# Altium footprint library YS_PCBLIB.PcbLib: 133 footprints (part 1 of 9)
Each footprint in its own frame and in the unit in brackets; x right, y up, seen from the top. Pads: shape width x height; smd on the part's side, far side on the other; paste and mask are expansions set on the pad; w line width, h text height; cw(c..) or ccw(c..) is an arc to the next point about the centre after c.
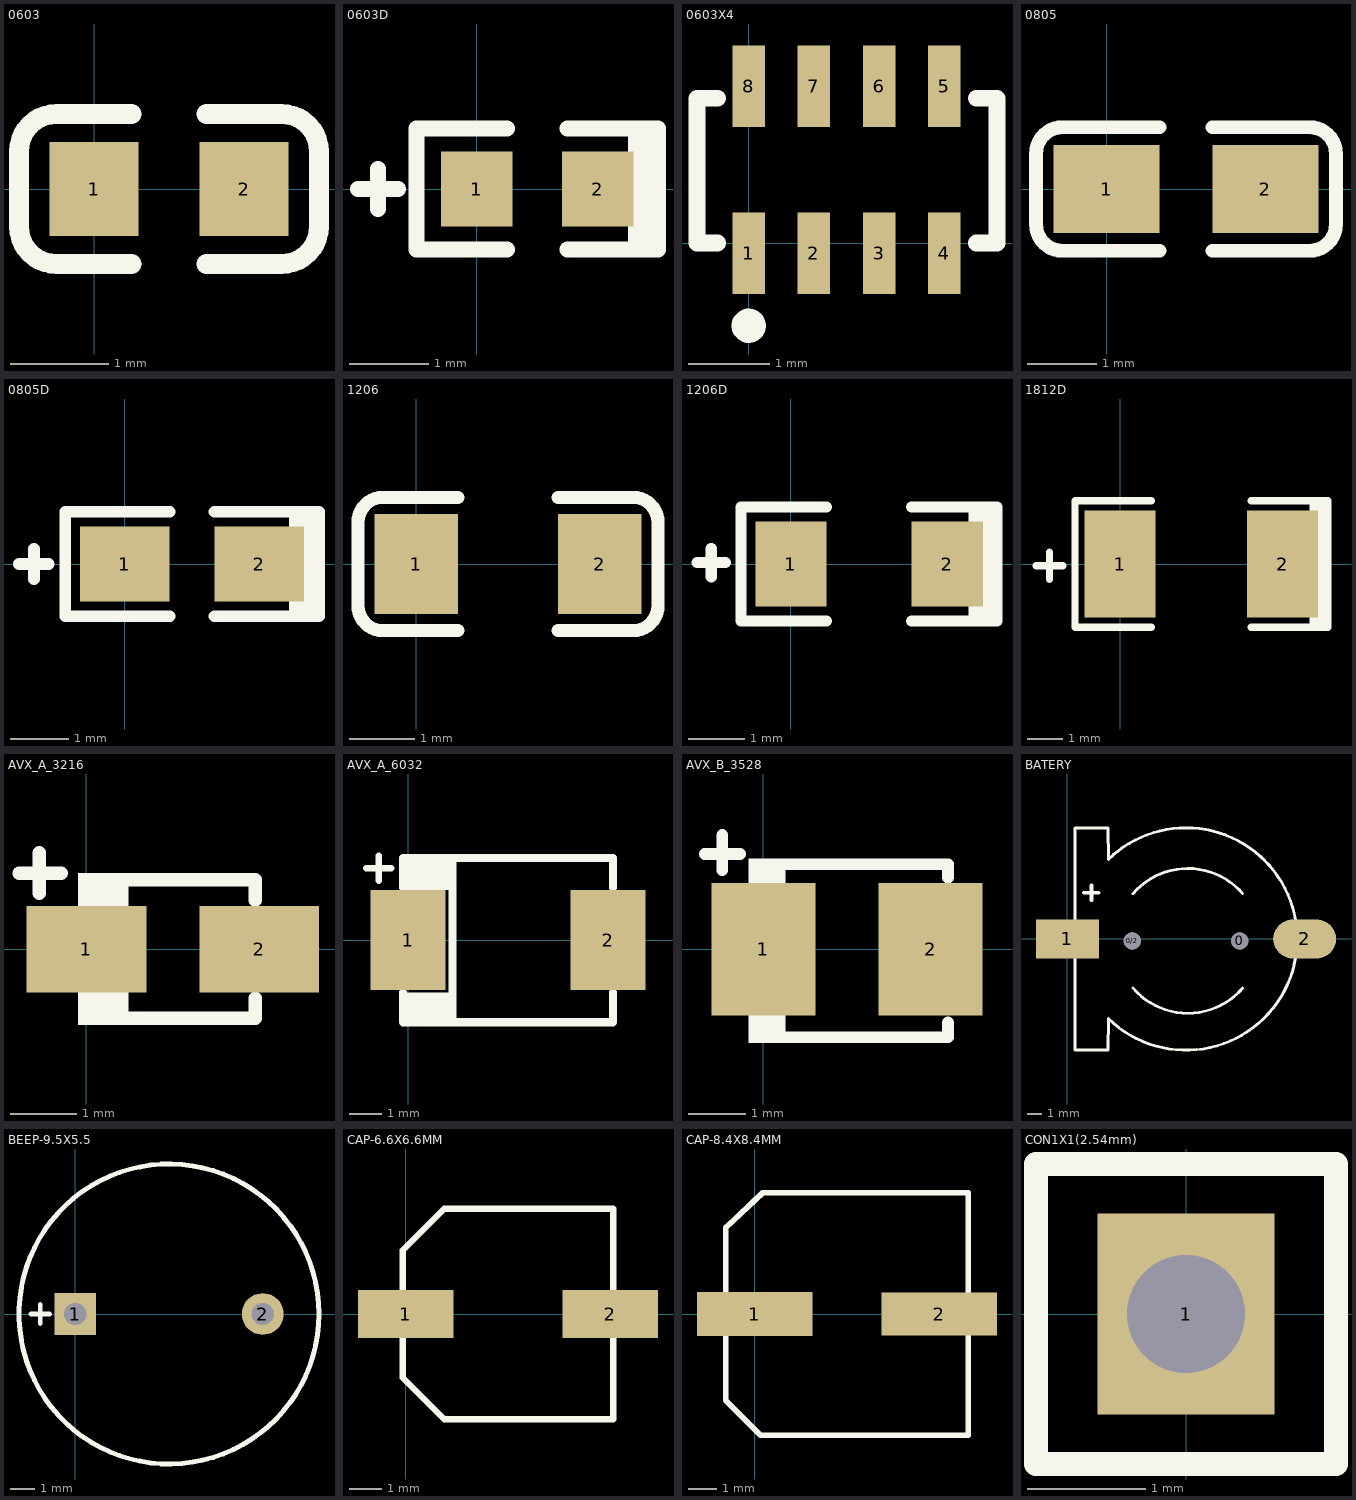
[diagram p0: the footprints below, top view; thin cyan lines are the x and y axes]

## 0603 [mm]
height 8.23
pads (2):
  rect 0.9x0.95 smd: 1(0,0) 2(1.524,0)
Top Overlay:
  lines w0.2: 0.381,-0.762 -0.381,-0.762 cw(c-0.381,-0.381) -0.762,-0.381 -0.762,0.381 cw(c-0.381,0.381) -0.381,0.762 0.381,0.762 ; 1.143,-0.762 1.905,-0.762 ccw(c1.905,-0.381) 2.286,-0.381 2.286,0.381 ccw(c1.905,0.381) 1.905,0.762 1.143,0.762

## 0603D [mm]
pads (2):
  rect 0.9x0.95 smd: 1(0,0) 2(1.524,0)
Top Overlay:
  rectangle: 1.905,-0.762 2.286,0.762
  lines w0.2: -1.499,0 -0.991,0 ; -1.245,-0.254 -1.245,0.254 ; 0.381,-0.762 -0.762,-0.762 -0.762,0.762 0.381,0.762 ; 1.143,-0.762 2.286,-0.762 2.286,0.762 1.143,0.762

## 0603X4 [mm]
pads (8):
  rect 0.4x1 smd: 1(0,-0.127) 2(0.8,-0.127) 3(1.6,-0.127) 4(2.4,-0.127) 5(2.4,1.927) 6(1.6,1.927) 7(0.8,1.927) 8(0,1.927)
Top Overlay:
  circle w0.25: c0,-1.016 r0.085
  lines w0.203: -0.381,0 -0.635,0 -0.635,1.778 -0.381,1.778 ; 2.794,0 3.048,0 3.048,1.778 2.794,1.778

## 0805 [mil]
pads (2):
  rect 60x50 smd: 1(0,0) 2(90,0)
Top Overlay:
  lines w7.87: 30,-35 -25,-35 cw(c-25,-20) -40,-20 -40,20 cw(c-25,20) -25,35 30,35 ; 60,-35 115,-35 ccw(c115,-20) 130,-20 130,20 ccw(c115,20) 115,35 60,35

## 0805D [mil]
pads (2):
  rect 60x50 smd: 1(0,0) 2(90,0)
Top Overlay:
  rectangle: 110,-35 130,35
  lines w7.87: -71,0 -51,0 ; -61,-10 -61,10 ; 30,-35 -40,-35 -40,35 30,35 ; 60,-35 130,-35 130,35 60,35

## 1206 [mil] "元件 长X宽=120X60mil"
height 40
pads (2):
  rect 50x60 smd: 1(0,0) 2(110,0)
Top Overlay:
  lines w7.87: 25,-40 -20,-40 cw(c-20,-25) -35,-25 -35,25 cw(c-20,25) -20,40 25,40 ; 85,-40 130,-40 ccw(c130,-25) 145,-25 145,25 ccw(c130,25) 130,40 85,40

## 1206D [mil] "元件 长X宽=120X60mil"
height 40
pads (2):
  rect 50x60 smd: 1(0,0) 2(110,0)
Top Overlay:
  rectangle: 125,-40 145,40
  lines w7.87: -66,1 -46,1 ; -56,-9 -56,11 ; 25,-40 -35,-40 -35,40 25,40 ; 85,-40 145,-40 145,40 85,40

## 1812D [mm]
height 2.032
pads (2):
  rect 2x3 smd: 1(0,0) 2(4.572,0)
Top Overlay:
  rectangle: 5.334,-1.778 5.842,1.778
  lines w0.2: -2.362,-0.051 -1.6,-0.051 ; -1.981,-0.432 -1.981,0.33 ; 0.889,-1.778 -1.27,-1.778 -1.27,1.778 0.889,1.778 ; 3.683,-1.778 5.842,-1.778 5.842,1.778 3.683,1.778

## AVX_A_3216 [mm]
pads (2):
  rect 1.8x1.3 smd: 1(0,0) 2(2.6,0)
Top Overlay:
  rectangle: -0.127,-1.143 0.635,-0.635
  rectangle: -0.127,0.635 0.635,1.143
  lines w0.203: -1.016,1.143 -0.381,1.143 ; -0.711,0.838 -0.711,1.448 ; 0.127,1.041 2.54,1.041 2.54,0.737 ; 0.203,-1.041 2.54,-1.041 2.54,-0.737

## AVX_A_6032 [mil]
pads (2):
  rect 90x120 smd: 1(0,0) 2(240,0)
Top Overlay:
  rectangle: -5.98,60 53.47,98.42
  rectangle: -5.98,-94.49 53.47,-62.99
  lines w7.87: -50,86 -20,86 ; -35,71 -35,101
  lines w10: -5.98,-62.99 -5.98,-98.43 245.98,-98.43 245.98,-62.99 ; -5.98,62.99 -5.98,98.42 245.98,98.42 245.98,62.99 ; 53.47,-94.49 53.47,98.42

## AVX_B_3528 [mm]
pads (2):
  rect 1.8x2.3 smd: 1(0,0) 2(2.9,0)
Top Overlay:
  rectangle: -0.254,1.143 0.381,1.575
  rectangle: -0.254,-1.626 0.381,-1.143
  lines w0.203: -1.016,1.651 -0.406,1.651 ; -0.711,1.372 -0.711,1.981 ; -0.127,-1.524 3.2,-1.524 3.2,-1.27 ; -0.127,1.473 3.2,1.473 3.2,1.245

## BATERY [mil]
pads (4):
  round 46 hole 46: 0(465,-5) 0/2(175,-5)
  rect 169.29x106.3 smd: 1(0,0)
  oval 169.29x106.3 smd: 2(640,0)
Top Overlay:
  lines w7.87: 110.38,-214.61 110,-300 20,-300 20,0 20,300 110,300 110.38,214.61 ; 110.48,-214.71 ccw(c320,0) 618.19,-32.92 ; 110.48,214.71 cw(c320,0) 320,300 cw(c320,0) 618.19,32.92 ; 176.75,122.07 cw(c325,-5) 472.55,122.88 ; 177.11,-132.49 ccw(c325,-5) 472.89,-132.49
  lines w10: 45,125 85,125 ; 65,105 65,145

## BEEP-9.5X5.5 [mm]
pads (2):
  rect 1.7x1.7 hole 0.9: 1(0,0)
  round 1.7 hole 0.9: 2(7.62,0)
Top Overlay:
  circle w0.2: c3.81,0 r6.096
  lines w0.2: -1.803,0 -1.041,0 ; -1.422,-0.381 -1.422,0.381

## CAP-6.6X6.6MM [mm]
pads (2):
  rect 3x1.5 smd: 1(0,0) 2(6.4,0)
Top Overlay:
  lines w0.2: -0.1,-2 1.2,-3.3 6.5,-3.3 6.5,3.3 1.2,3.3 -0.1,2 -0.1,-2

## CAP-8.4X8.4MM [mm]
pads (2):
  rect 4x1.524 smd: 1(0,0)
  rect 4x1.5 smd: 2(6.4,0)
Top Overlay:
  lines w0.2: -1,-3 -1,3 0.28,4.2 7.4,4.2 7.4,-4.2 0.2,-4.2 -1,-3

## CON1X1(2.54mm) [mm] "Connector; Header; 2 Position"
pads (1):
  rect 1.5x1.7 hole 1: 1(0,0)
Top Overlay:
  lines w0.2: -1.27,-1.27 1.27,-1.27 1.27,1.27 -1.27,1.27 -1.27,-1.27